# Altium footprint library FOTA.PcbLib: 41 footprints (part 1 of 3)
Each footprint in its own frame and in the unit in brackets; x right, y up, seen from the top. Pads: shape width x height; smd on the part's side, far side on the other; paste and mask are expansions set on the pad; w line width, h text height; cw(c..) or ccw(c..) is an arc to the next point about the centre after c.
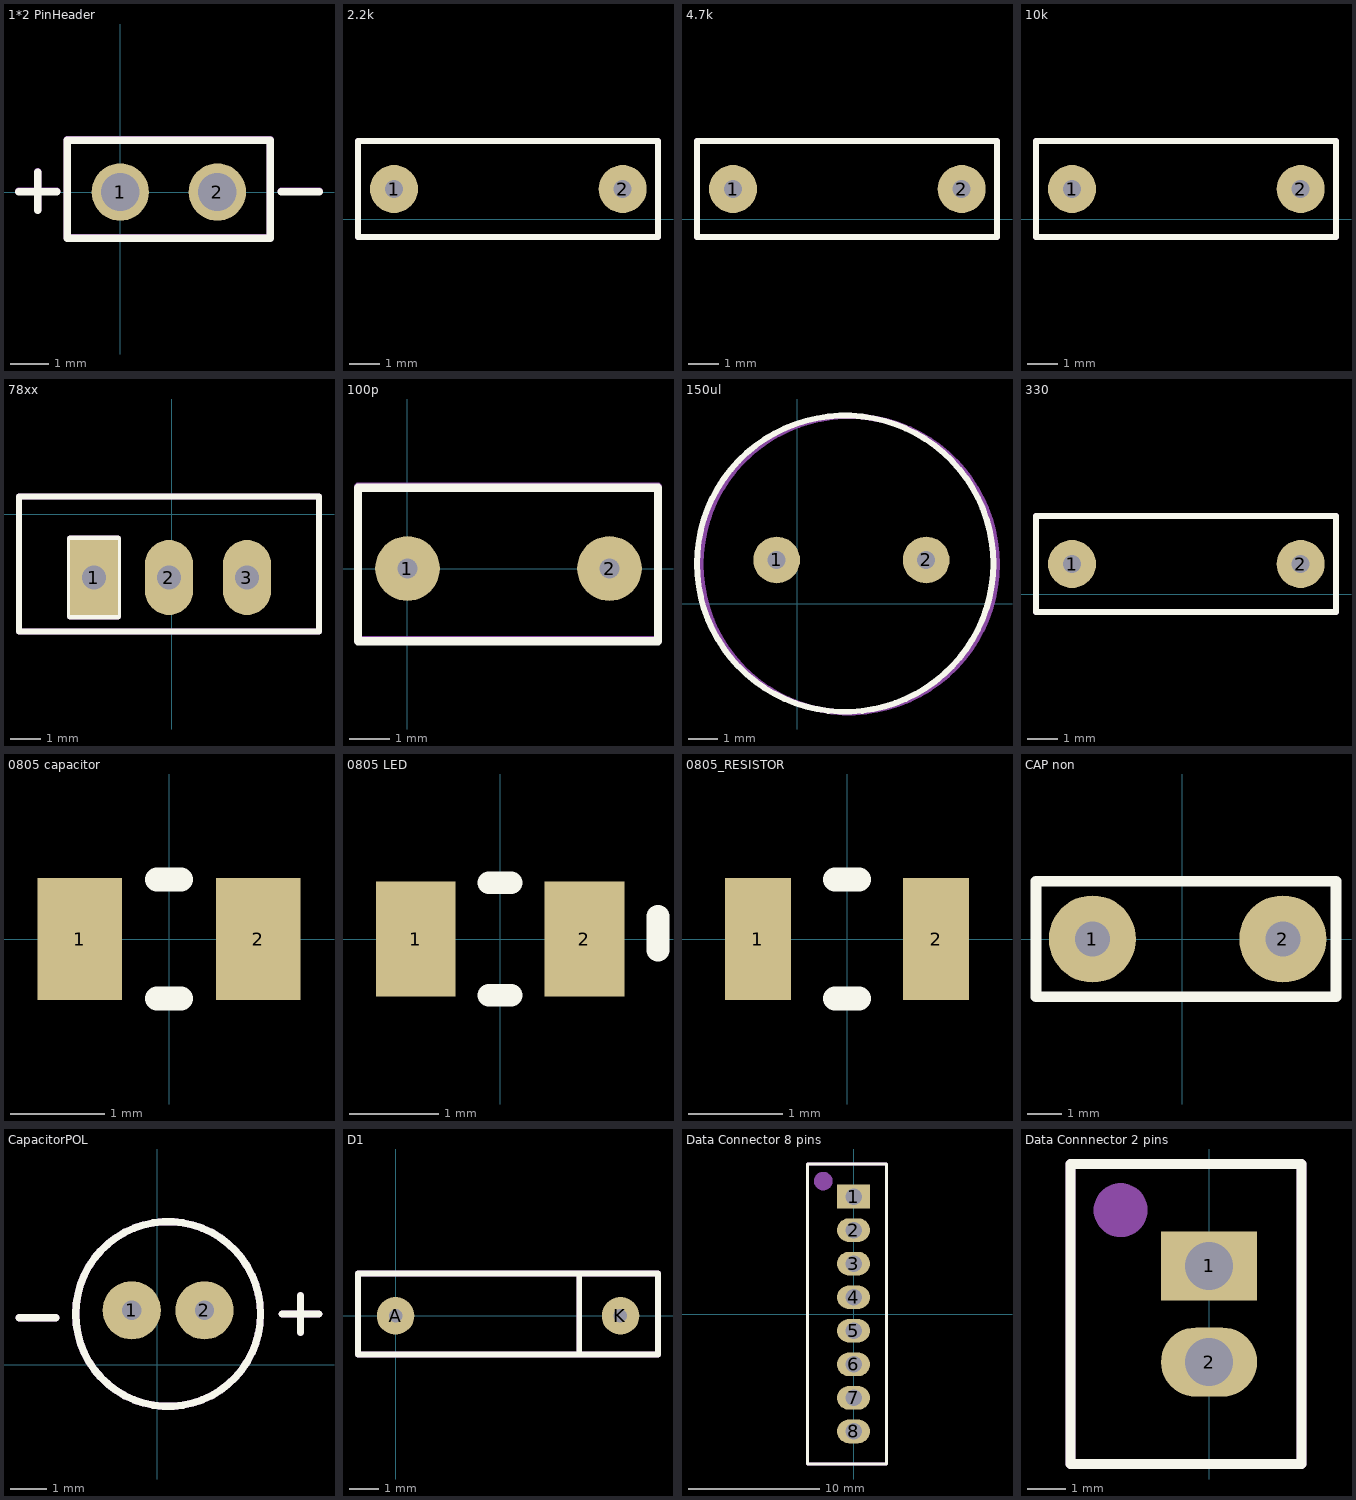
[diagram p0: the footprints below, top view; thin cyan lines are the x and y axes]

## 1*2 PinHeader [mm]
pads (2):
  round 1.5 hole 1: 1(0,0) 2(2.54,0)
Top Overlay:
  lines w0.2: -2.65,0.01 -1.66,0.01 ; -2.16,-0.47 -2.16,0.52 ; 4.21,0.01 5.2,0.01 ; -1.385,-1.21 3.925,-1.21 3.925,0 3.925,1.36 -1.385,1.36 -1.385,-1.21
Mechanical 29:
  lines w0.2: -2.65,0.02 -1.66,0.02 ; -2.16,-0.46 -2.16,0.53 ; 4.21,0.02 5.2,0.02 ; -1.385,-1.2 -1.385,1.37 3.925,1.37 3.925,0.01 3.925,-1.2 -1.385,-1.2
  text "'.Designator'" at -1.19,-0.91 h1.02
3D body "61300211121.stp": height 8.55, standoff -2.99, extent -1.26,-1.22 3.82,1.32

## 2.2k [mm]
pads (2):
  round 1.6 hole 0.6: 1(3.1,1) 2(10.72,1)
Top Overlay:
  lines w0.2: 1.9,-0.6 1.9,2.6 11.9,2.6 11.9,-0.6 1.9,-0.6
Mechanical 29:
  lines w0.2: 1.9,-0.6 11.9,-0.6 11.9,2.6 1.9,2.6 1.9,-0.6
3D body "Yageo CFR-25 Resistor Axial P7.62mm 2,2 kOhm.stp": height 2.44, standoff -3, extent 2.85,-0.162 11.02,2.125

## 4.7k [mm]
pads (2):
  round 1.6 hole 0.6: 1(3.1,1) 2(10.72,1)
Top Overlay:
  lines w0.2: 1.9,-0.6 1.9,2.6 11.9,2.6 11.9,-0.6 1.9,-0.6
Mechanical 29:
  lines w0.2: 1.9,-0.6 11.9,-0.6 11.9,2.6 1.9,2.6 1.9,-0.6
3D body "Yageo CFR-25 Resistor Axial P7.62mm 4,7 kOhm.stp": height 2.44, standoff -3, extent 2.825,-0.144 10.995,2.144

## 10k [mm]
pads (2):
  round 1.6 hole 0.6: 1(3.1,1) 2(10.72,1)
Top Overlay:
  lines w0.2: 1.9,-0.6 11.9,-0.6 11.9,2.6 1.9,2.6 1.9,-0.6
Mechanical 29:
  lines w0.2: 1.9,-0.6 1.9,2.6 11.9,2.6 11.9,-0.6 1.9,-0.6
3D body "Yageo CFR-25 Resistor Axial P7.62mm 10,0 kOhm.stp": height 2.44, standoff -3, extent 2.825,-0.144 10.995,2.144

## 78xx [mm]
pads (3):
  rect 1.6x2.5 hole 0.8: 1(-2.6,-2.1)
  oval 1.6x2.5 hole 0.8: 2(-0.1,-2.1) 3(2.5,-2.1)
Top Overlay:
  lines w0.2: -5.1,-3.9 -5.1,0.6 4.9,0.6 4.9,-3.9 -5.1,-3.9 ; -3.4,-3.4 -1.8,-3.4 -1.8,-0.8 -3.4,-0.8 -3.4,-3.4
Mechanical 29:
  lines w0.2: -5.1,-3.9 4.9,-3.9 4.9,0.6 -5.1,0.6 -5.1,-3.9 ; -3.4,-3.4 -3.4,-0.8 -1.8,-0.8 -1.8,-3.4 -3.4,-3.4
  text "'.Designator'" at -5.3,-0.4 h1.02
3D body "lm7805act.stp": height 18.51, standoff -9.96, extent -5.13,-3.8 4.93,0.64

## 100p [mm]
pads (2):
  round 1.6 hole 0.5: 1(0,0) 2(5,0)
Top Overlay:
  lines w0.2: -1.225,-1.8 -1.225,2 0.631,2 4.344,2 6.2,2 6.2,-1.8 -1.225,-1.8
Mechanical 29:
  lines w0.2: -1.225,-1.775 6.2,-1.775 6.2,2.025 4.344,2.025 0.631,2.025 -1.225,2.025 -1.225,-1.775
  text "'.Designator'" at -2.175,-1.325 h1.02
3D body "CAP_DISC_4x3_YL.stp": height 4.47, standoff -3, extent -0.275,-1.55 5.175,1.45

## 150ul [mm]
pads (2):
  round 1.6 hole 0.61: 1(-0.7,1.5) 2(4.425,1.5)
Top Overlay:
  circle w0.2: c1.65,1.375 r5.08
Mechanical 29:
  circle w0.2: c1.775,1.35 r5.08
  text "'.Designator'" at -1.9,-0.6 h1.02
3D body "IND_RAD_D8x10_HS.stp": height 11.35, standoff -2.5, extent -2.575,-2.972 6.325,5.922

## 330 [mm]
pads (2):
  round 1.6 hole 0.6: 1(3.1,1) 2(10.72,1)
Top Overlay:
  lines w0.2: 1.9,-0.6 1.9,2.6 11.9,2.6 11.9,-0.6 1.9,-0.6
Mechanical 29:
  lines w0.2: 1.9,-0.6 11.9,-0.6 11.9,2.6 1.9,2.6 1.9,-0.6
3D body "Yageo CFR-25 Resistor Axial P7.62mm 330,0 Ohm.stp": height 2.44, standoff -3, extent 2.825,-0.144 10.995,2.144

## 0805 capacitor [mm]
pads (2):
  rect 0.9x1.3 smd: 1(-0.95,0) 2(0.95,0)
Top Overlay:
  lines w0.254: -0.127,-0.635 0.127,-0.635 ; -0.127,0.635 0.127,0.635
3D body "Ceramic_Capacitor_0805_h24mil.step": height 0.61, standoff 0.01, extent -1,-0.625 1,0.625

## 0805 LED [mm]
pads (2):
  rect 0.9x1.3 smd: 1(-0.95,0) 2(0.95,0)
Top Overlay:
  lines w0.254: -0.127,-0.635 0.127,-0.635 ; -0.127,0.635 0.127,0.635 ; 1.778,-0.127 1.778,0.254
3D body "LED0805.STEP": height 1.1, standoff 0, extent -1.01,-0.625 1.01,0.625

## 0805_RESISTOR [mm]
pads (2):
  rect 0.7x1.3 smd: 1(-0.95,0) 2(0.95,0)
Top Overlay:
  lines w0.254: -0.127,-0.635 0.127,-0.635 ; -0.127,0.635 0.127,0.635
3D body "Resistor_0805.step": height 0.51, standoff 0.01, extent -1,-0.625 1,0.625

## CAP non [mm]
pads (2):
  round 2.5 hole 1: 1(-2.581,0) 2(2.88,0)
Top Overlay:
  lines w0.305: -4.2,-1.651 4.404,-1.651 4.404,1.651 -4.2,1.651 -4.2,-1.651
Mechanical 2:
  lines w0.254: -4.2,-1.651 -4.2,1.651 4.404,1.651 4.404,-1.651 -4.2,-1.651
  text ".Designator" at -1.184,-0.508 h1.52
3D body "User Library-Ceramic Capacitors(K104K15X7RF5TH5).step": height 5.2, standoff -5, extent -2.787,-1.3 3.213,1.3

## CapacitorPOL [mm]
pads (2):
  round 1.6 hole 0.533: 1(-0.7,1.5) 2(1.3,1.5)
Top Overlay:
  circle w0.2: c0.3,1.4 r2.54
  lines w0.2: -3.8,1.3 -2.784,1.3 ; 3.94,0.892 3.94,1.908 ; 3.432,1.4 4.448,1.4 3.432,1.4
Mechanical 29:
  circle w0.2: c0.3,1.4 r2.54
  lines w0.2: -3.8,1.3 -2.784,1.3 ; 3.94,0.892 3.94,1.908 ; 3.432,1.4 4.448,1.4 3.432,1.4
  text "'.Designator'" at -1.9,-0.6 h1.02
3D body "CAP_RAD_D5x11_POL_BK.stp": height 12.5, standoff -2.5, extent -2.45,-1.25 3.05,4.25

## D1 [mil]
pads (2):
  round 50 hole 18: A(0,0) K(300,0)
Top Overlay:
  lines w7.87: 245,-50 245,51.73 ; -50,-51.77 350,-51.77 350,56.5 170,56.5 -50,56.5 -50,-51.77
Mechanical 29:
  lines w7.87: 245,-50 245,51.73 ; -50,-51.77 -50,56.5 170,56.5 350,56.5 350,-51.77 -50,-51.77
  text "'.Designator'" at -60,-35 h40
3D body "diode.stp": height 84.25, standoff -377.95, extent -8.84,-32.87 308.84,33.14

## Data Connector 8 pins [mm]
pads (8):
  rect 2.5x1.8 hole 1.25: 1(0,8.925)
  oval 2.5x1.8 hole 1.25: 2(0,6.375) 3(0,3.825) 4(0,1.275) 5(0,-1.275) 6(0,-3.825) 7(0,-6.375) 8(0,-8.925)
Top Overlay:
  lines w0.254: -3.5,-11.4 -3.5,11.4 2.5,11.4 2.5,-11.4 -3.5,-11.4
Mechanical 2:
  circle w0.8: c-2.3,10.1 r0.3
  lines w0.254: -3.5,-11.4 -3.5,11.4 2.5,11.4 2.5,-11.4 -3.5,-11.4
  text ".Designator" at -1.2,6.5 h2
3D body "User Library-B8B-XH-A.step": height 7.01, standoff -3.39, extent -3.4,-11.2 2.35,11.2

## Data Connnector 2 pins [mm]
pads (2):
  rect 2.5x1.8 hole 1.25: 1(0,6.25)
  oval 2.5x1.8 hole 1.25: 2(0,3.75)
Top Overlay:
  lines w0.254: -3.6,1.1 2.4,1.1 2.4,8.9 -3.6,8.9 -3.6,1.1
Mechanical 2:
  circle w1: c-2.3,7.7 r0.2
  lines w0.254: -3.6,1.1 -3.6,8.9 2.4,8.9 2.4,1.1 -3.6,1.1
  text ".Designator" at -1.3,8.4 h2
3D body "User Library-JST B2B-XH-A.step": height 7.01, standoff -3.39, extent -3.475,1.3 2.275,8.7